# Altium footprint library 2.02-SOT封装.PcbLib: 59 footprints (part 2 of 4)
Each footprint in its own frame and in the unit in brackets; x right, y up, seen from the top. Pads: shape width x height; smd on the part's side, far side on the other; paste and mask are expansions set on the pad; w line width, h text height; cw(c..) or ccw(c..) is an arc to the next point about the centre after c.
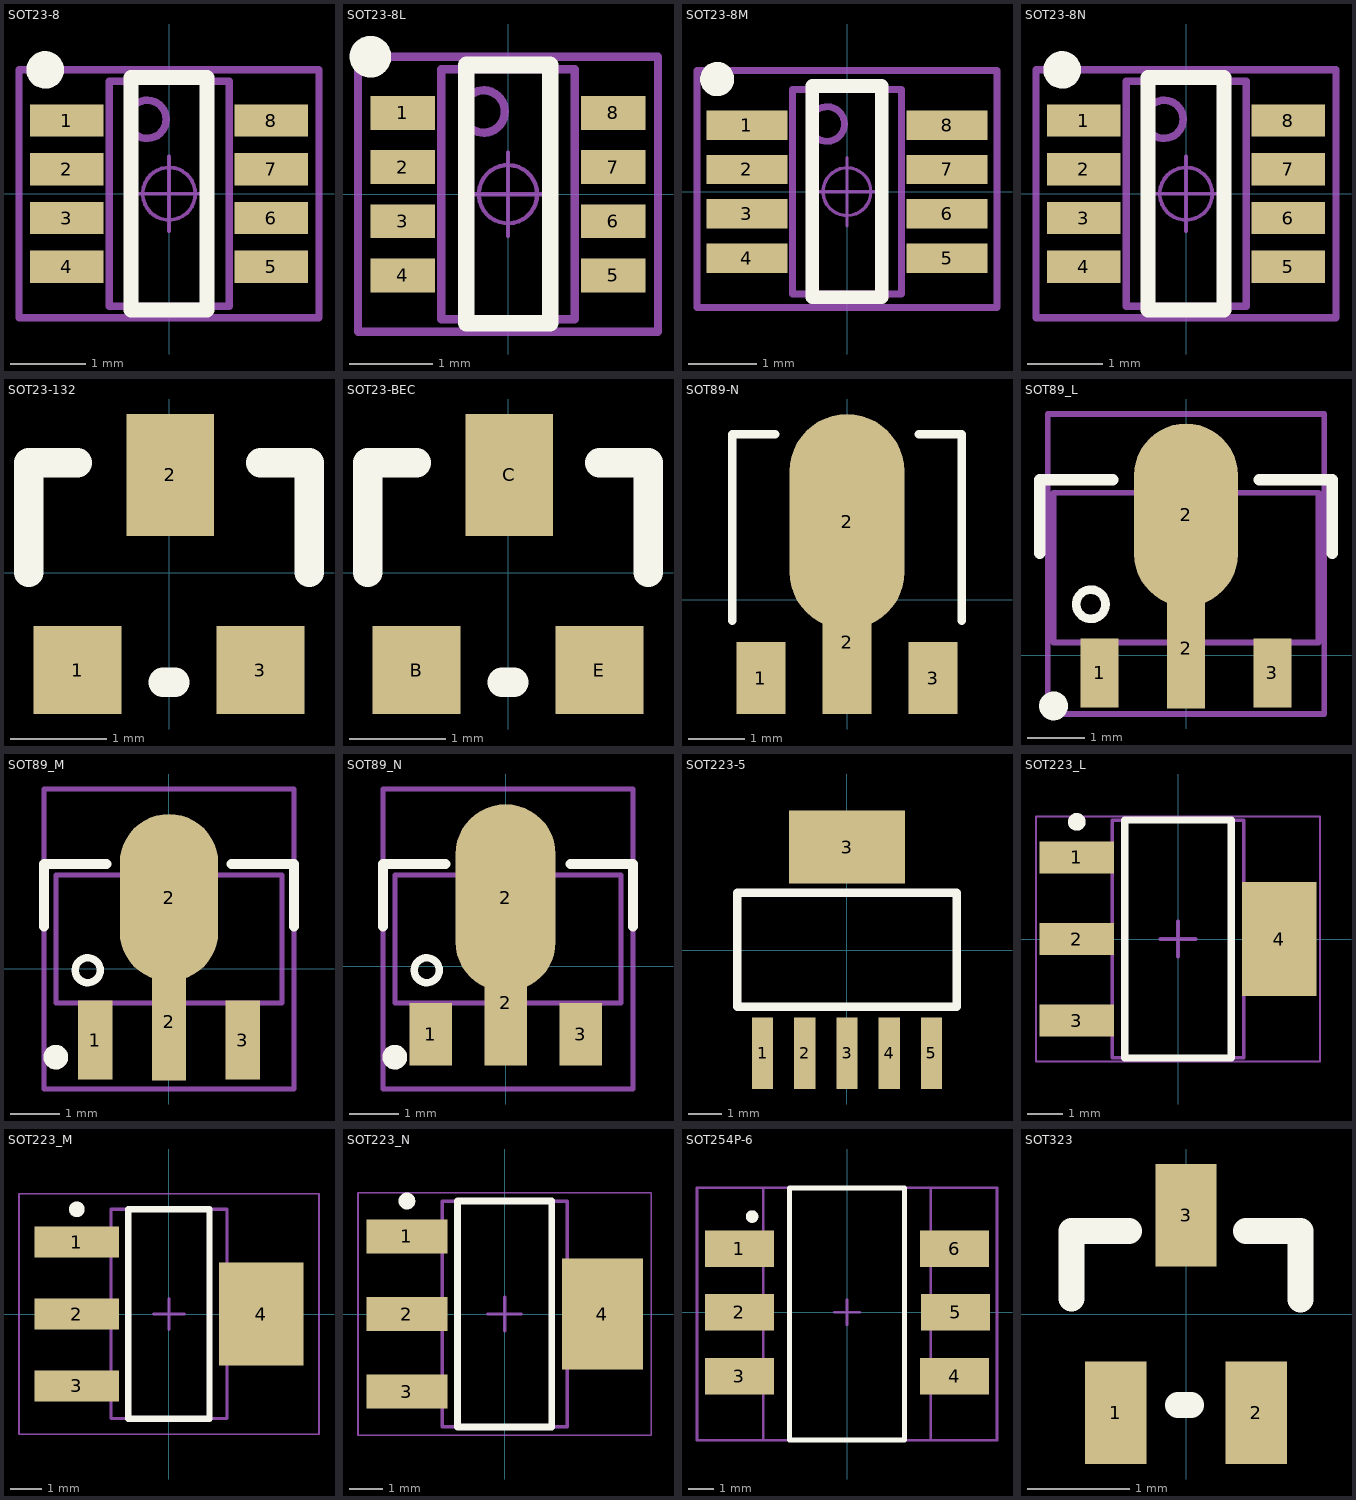
[diagram p1: the footprints below, top view; thin cyan lines are the x and y axes]

## SOT23-8 [mil] "SOT23, 8-Leads, Body 2.9x1.75mm, Pitch 0.65mm  联系卖家 免费查找封装"
pads (8):
  rect 38.5x17 smd paste+0: 1(-53.75,38.39) 2(-53.75,12.8) 3(-53.75,-12.8) 4(-53.75,-38.39) 5(53.75,-38.39) 6(53.75,-12.8) 7(53.75,12.8) 8(53.75,38.39)
Top Overlay:
  circle w9.84: c-64.99,64.99 r4.92
  lines w7.87: -19.99,-61.04 20.01,-61.04 20.01,61.01 -19.99,61.01 -19.99,-61.04
Mechanical 13:
  circle w3.94: c-11.49,39.04 r10
  lines w3.94: -31.48,-59.06 -31.48,59.05 31.51,59.05 31.51,-59.06 -31.48,-59.06
Mechanical 15:
  circle w1.97: c0.01,-0.01 r13.78
  lines w1.97: -19.68,-0.01 19.69,-0.01 ; 0.01,-19.7 0.01,19.67
  lines w3.94: -78.74,-65.01 -78.74,64.99 78.74,64.99 78.74,-65.01 -78.74,-65.01
3D body "SOT23-8.STEP": height 47.28, standoff 2, extent -55.24,-59.07 55.26,59.04

## SOT23-8L [mil] "SOT23, 8-Leads, Body 2.9x1.75mm, Pitch 0.65mm"
pads (8):
  rect 30.5x16 smd paste+0: 1(-49.75,38.39) 2(-49.75,12.8) 3(-49.75,-12.8) 4(-49.75,-38.39) 5(49.75,-38.39) 6(49.75,-12.8) 7(49.75,12.8) 8(49.75,38.39)
Top Overlay:
  circle w9.84: c-65.01,64.96 r4.92
  lines w7.87: -19.69,-61.02 -19.69,61.02 19.99,61.02 19.99,-61.02 -19.69,-61.02
Mechanical 13:
  circle w3.94: c-11.5,39.06 r10
  lines w3.94: -31.5,-59.06 31.49,-59.06 31.49,59.06 -31.5,59.06 -31.5,-59.06
Mechanical 15:
  circle w1.97: c-0.01,0 r13.78
  lines w1.97: -19.69,0 19.68,0 ; -0.01,-19.68 -0.01,19.68
  lines w3.94: -70.87,-64.96 70.87,-64.96 70.87,64.96 -70.87,64.96 -70.87,-64.96
3D body "SOT23-8.STEP": height 45.28, standoff 0, extent -55.25,-59.06 55.25,59.06

## SOT23-8M [mil] "SOT23, 8-Leads, Body 2.9x1.75mm, Pitch 0.65mm"
pads (8):
  rect 46.5x17 smd paste+0: 1(-57.75,38.39) 2(-57.75,12.8) 3(-57.75,-12.8) 4(-57.75,-38.39) 5(57.75,-38.39) 6(57.75,-12.8) 7(57.75,12.8) 8(57.75,38.39)
Top Overlay:
  circle w9.84: c-75,64.99 r4.92
  lines w7.87: -20,-61.03 20,-61.03 20,61.02 -20,61.02 -20,-61.03
Mechanical 13:
  circle w3.94: c-11.5,39.05 r10
  lines w3.94: -31.49,-59.06 -31.49,59.05 31.51,59.05 31.51,-59.06 -31.49,-59.06
Mechanical 15:
  circle w1.97: c0,-0.01 r13.78
  lines w1.97: -19.68,-0.01 19.68,-0.01 ; 0,-19.69 0,19.68
  lines w3.94: -86.61,-66.93 -86.61,69.99 86.61,69.99 86.61,-66.93 -86.61,-66.93
3D body "SOT23-8.STEP": height 45.28, standoff 0, extent -55.25,-59.06 55.26,59.05

## SOT23-8N [mil] "SOT23, 8-Leads, Body 2.9x1.75mm, Pitch 0.65mm."
pads (8):
  rect 38.5x17 smd paste+0: 1(-53.75,38.39) 2(-53.75,12.8) 3(-53.75,-12.8) 4(-53.75,-38.39) 5(53.75,-38.39) 6(53.75,-12.8) 7(53.75,12.8) 8(53.75,38.39)
Top Overlay:
  circle w9.84: c-64.99,64.99 r4.92
  lines w7.87: -19.99,-61.04 20.01,-61.04 20.01,61.01 -19.99,61.01 -19.99,-61.04
Mechanical 13:
  circle w3.94: c-11.49,39.04 r10
  lines w3.94: -31.48,-59.06 -31.48,59.05 31.51,59.05 31.51,-59.06 -31.48,-59.06
Mechanical 15:
  circle w1.97: c0.01,-0.01 r13.78
  lines w1.97: -19.68,-0.01 19.69,-0.01 ; 0.01,-19.7 0.01,19.67
  lines w3.94: -78.74,-65.01 -78.74,64.99 78.74,64.99 78.74,-65.01 -78.74,-65.01
3D body "SOT23-8.STEP": height 47.28, standoff 2, extent -55.24,-59.05 55.26,59.06

## SOT23-132 [mil] "联系卖家 免费查找封装"
pads (3):
  rect 36x36 smd: 1(-37.5,-40) 3(37.5,-40)
  rect 36x50 smd: 2(0.5,40)
Top Overlay:
  lines w12: -57.5,0 -57.5,45 -37.5,45 ; -2.5,-45 2.5,-45 ; 37.5,45 57.5,45 57.5,0
3D body "SOT23-3-2.STEP": height 41.34, standoff 0, extent -60.61,-47.24 57.5,47.24

## SOT23-BEC [mil] "联系卖家 免费查找封装"
pads (3):
  rect 36x36 smd: B(-37.5,-40) E(37.5,-40)
  rect 36x50 smd: C(0.5,40)
Top Overlay:
  lines w12: -57.5,0 -57.5,45 -37.5,45 ; -2.5,-45 2.5,-45 ; 37.5,45 57.5,45 57.5,0
3D body "SOT23-3-2.STEP": height 41.34, standoff 0, extent -60.61,-47.24 57.5,47.24

## SOT89-N [mil] "联系卖家 免费查找封装"
pads (4):
  rect 34.02x50 smd: 1(-60,-54.47) 3(60,-54.47)
  rect 34x100 smd: 2(0,-29.47)
  oval 80x150 smd: 2(0,54.47)
Top Overlay:
  lines w5.91: -80,-14.47 -80,115.53 -50,115.53 ; 50,115.53 80,115.53 80,-14.47
3D body "SW3dPS-SOT89.STEP": height 62.57, standoff -0.76, extent -90.55,-71.12 90.55,96.2

## SOT89_L [mm] "4.6x4.3x1.6mm(长宽高)                联系卖家 免费查找封装"
height 1.6
pads (4):
  rect 0.66x1.2 smd: 1(-1.5,-0.303) 3(1.5,-0.303)
  rect 0.66x2.1 smd: 2(0,0.127)
  oval 1.8x3.175 smd: 2(0,2.441)
Top Overlay:
  circle w0.25: c-2.3,-0.876 r0.125
  circle w0.15: c-1.651,0.889 r0.254
  lines w0.2: -2.54,1.778 -2.54,3.048 -1.27,3.048 ; 1.27,3.048 2.54,3.048 2.54,1.778
Mechanical 13:
  circle w0.1: c-1.651,0.889 r0.25
  lines w0.1: -2.3,0.224 2.3,0.224 2.3,2.824 -2.3,2.824 -2.3,0.224
Mechanical 15:
  circle w0.05: c0,1.524 r0.35
  lines w0.05: -0.5,1.524 0.5,1.524 ; 0,1.024 0,2.024
  lines w0.1: -2.4,-1.016 2.4,-1.016 2.4,4.191 -2.4,4.191 -2.4,-1.016
3D body "SOT89.STEP": height 1.6, standoff 0.04, extent -2.3,-0.825 2.3,3.475

## SOT89_M [mm] "4.6x4.3x1.6mm(长宽高)                联系卖家 免费查找封装"
height 1.6
pads (4):
  rect 0.7x1.6 smd: 1(-1.5,-1.448) 3(1.5,-1.448)
  rect 0.7x2.4 smd: 2(0,-1.071)
  oval 2x3.4 smd: 2(0,1.448)
Top Overlay:
  circle w0.15: c-1.651,-0.029 r0.254
  circle w0.25: c-2.3,-1.794 r0.125
  lines w0.2: -2.54,0.86 -2.54,2.13 -1.27,2.13 ; 1.27,2.13 2.54,2.13 2.54,0.86
Mechanical 13:
  circle w0.1: c-1.651,-0.029 r0.25
  lines w0.1: -2.3,-0.694 -2.3,1.906 2.3,1.906 2.3,-0.694 -2.3,-0.694
Mechanical 15:
  circle w0.05: c0,0.606 r0.35
  lines w0.05: -0.5,0.606 0.5,0.606 ; 0,0.106 0,1.106
  lines w0.1: -2.54,-2.442 2.54,-2.442 2.54,3.654 -2.54,3.654 -2.54,-2.442
3D body "SOT89.STEP": height 1.6, standoff 0.04, extent -2.275,-1.775 2.325,2.525

## SOT89_N [mil] "4.6x4.3x1.6mm(长宽高)                联系卖家 免费查找封装"
height 62.99
pads (4):
  rect 34.02x50 smd: 1(-60,-54.47) 3(60,-54.47)
  rect 34x100 smd: 2(0,-29.47)
  oval 80x150 smd: 2(0,54.47)
Top Overlay:
  circle w9.84: c-88.58,-72.84 r4.92
  circle w5.91: c-63.03,-3.35 r10
  lines w7.87: -98.03,31.65 -98.03,81.65 -48.03,81.65 ; 51.97,81.65 101.97,81.65 101.97,31.65
Mechanical 13:
  circle w3.94: c-63.03,-3.35 r9.84
  lines w3.94: -88.58,-29.53 92.52,-29.53 92.52,72.83 -88.58,72.83 -88.58,-29.53
Mechanical 15:
  circle w1.97: c1.97,21.65 r13.78
  lines w1.97: -17.72,21.65 21.65,21.65 ; 1.97,1.97 1.97,41.34
  lines w3.94: -98.03,-98.35 -98.03,141.65 101.97,141.65 101.97,-98.35 -98.03,-98.35
3D body "SOT89.STEP": height 62.99, standoff 1.57, extent -88.58,-72.83 92.52,96.46

## SOT223-5 [mm] "联系卖家 免费查找封装"
pads (6):
  rect 0.635x2.15 smd: 1(-2.54,-3.1) 2(-1.27,-3.1) 3(0,-3.1) 4(1.27,-3.1) 5(2.54,-3.1)
  rect 3.5x2.2 smd: 3(0,3.1)
Top Overlay:
  lines w0.254: -3.3,-1.7 -3.3,1.73 3.3,1.73 3.3,-1.7 -3.3,-1.7
3D body "SOT223-5.STEP": height 1.9, standoff -0.17, extent -3.275,-3.608 3.275,3.652

## SOT223_L [mm] "SOT223, 4-Leads, Body 6.5x3.5mm, Pitch 2.3mm, Lead Span 7mm, IPC High Density"
height 1.8
pads (4):
  rect 2.1x0.9 smd: 1(-2.85,2.3) 2(-2.85,0) 3(-2.85,-2.3)
  rect 2.1x3.2 smd: 4(2.85,0)
Top Overlay:
  circle w0.25: c-2.85,3.3 r0.125
  lines w0.2: -1.5,-3.35 1.5,-3.35 1.5,3.35 -1.5,3.35 -1.5,-3.35
Mechanical 13:
  lines w0.1: -1.855,-3.35 1.855,-3.35 1.855,3.35 -1.855,3.35 -1.855,-3.35
Mechanical 15:
  lines w0.05: -4,-3.45 4,-3.45 4,3.45 -4,3.45 -4,-3.45
  lines w0.1: -0.5,0 0.5,0 ; 0,-0.5 0,0.5
3D body "SOT223.STEP": height 1.65, standoff -0.02, extent -3.508,-3.25 3.508,3.25

## SOT223_M [mm] "SOT223, 4-Leads, Body 6.5x3.5mm, Pitch 2.3mm, Lead Span 7mm, IPC Low Density"
height 1.8
pads (4):
  rect 2.7x1 smd: 1(-2.95,2.3) 2(-2.95,0) 3(-2.95,-2.3)
  rect 2.7x3.3 smd: 4(2.95,0)
Top Overlay:
  circle w0.25: c-2.95,3.35 r0.125
  lines w0.2: -1.3,-3.35 -1.3,3.35 1.3,3.35 1.3,-3.35 -1.3,-3.35
Mechanical 13:
  lines w0.1: -1.855,-3.35 -1.855,3.35 1.855,3.35 1.855,-3.35 -1.855,-3.35
Mechanical 15:
  lines w0.05: -4.8,-3.85 -4.8,3.85 4.8,3.85 4.8,-3.85 -4.8,-3.85
  lines w0.1: -0.5,0 0.5,0 ; 0,-0.5 0,0.5
3D body "SOT223.STEP": height 1.65, standoff -0.02, extent -3.558,-3.3 3.458,3.2

## SOT223_N [mm] "SOT223, 4-Leads, Body 6.5x3.5mm, Pitch 2.3mm, Lead Span 7mm, IPC Medium Density  联系卖家 免费查找封装"
height 1.8
pads (4):
  rect 2.4x1 smd: 1(-2.9,2.3) 2(-2.9,0) 3(-2.9,-2.3)
  rect 2.4x3.3 smd: 4(2.9,0)
Top Overlay:
  circle w0.25: c-2.9,3.35 r0.125
  lines w0.2: -1.4,-3.35 -1.4,3.35 1.4,3.35 1.4,-3.35 -1.4,-3.35
Mechanical 13:
  lines w0.1: -1.855,-3.35 -1.855,3.35 1.855,3.35 1.855,-3.35 -1.855,-3.35
Mechanical 15:
  lines w0.05: -4.35,-3.6 -4.35,3.6 4.35,3.6 4.35,-3.6 -4.35,-3.6
  lines w0.1: -0.5,0 0.5,0 ; 0,-0.5 0,0.5
3D body "SOT223.STEP": height 1.65, standoff -0.02, extent -3.558,-3.3 3.458,3.2

## SOT254P-6 [mm] "继电器"
height 3.8
pads (6):
  rect 2.75x1.45 smd: 1(-4.283,2.54) 2(-4.283,0) 3(-4.283,-2.54) 4(4.283,-2.54) 5(4.318,0) 6(4.283,2.54)
Top Overlay:
  circle w0.25: c-3.775,3.815 r0.125
  lines w0.2: -2.286,-5.08 -2.286,4.953 2.286,4.953 2.286,-5.08 -2.286,-5.08
Mechanical 13:
  lines w0.1: -3.325,-5.08 3.325,-5.08 3.325,4.953 -3.325,4.953 -3.325,-5.08
Mechanical 15:
  lines w0.1: -0.5,0 0.5,0 ; 0,-0.5 0,0.5 ; -5.969,-5.08 5.969,-5.08 5.969,4.953 -5.969,4.953 -5.969,-5.08
3D body: height 3.8, standoff 0.05, extent -3.325,-5.08 3.325,4.953

## SOT323 [mm] "SOT323/SC70-3"
pads (3):
  rect 0.6x1 smd: 1(-0.686,-0.965) 2(0.686,-0.965) 3(0,0.965)
Top Overlay:
  lines w0.254: -1.118,0.152 -1.118,0.813 -0.559,0.813 ; -0.076,-0.889 0.051,-0.889 ; 0.584,0.813 1.118,0.813 1.118,0.143
3D body "SOT323_sc70-3.STEP": height 1.1, standoff 0, extent -1.15,-1.072 1.05,1.173